# Altium schematic symbol library jlcpcb_2025_04_capacitors_extended_0603.schlib: 3668 symbols (part 11 of 20) (continued)
## CC0603KRX7R9BB393
designator C?  Capacitance: 39nF  (hidden comment: *)
Capacitor, Ceramic (MLCC), 39nF, ±10%, 50V, X7R, ±10%, SMD 0603; Manufacturer: YAGEO; Manufacturer Part Number: CC0603KRX7R9BB393; Package Size: 0603; JLCPCB Basic Part: No; JLCPCB Part Number: C107091; Supplier 1: LCSC; Category: Capacitors - MLCC; Supplier Part Number 1: C107091; Tolerance: ±10%; Voltage Rating: 50V; Temperature Coefficient: X7R; RoHS: Yes; ComponentLink1Description: Datasheet; ComponentLink1URL: https://wmsc.lcsc.com/wmsc/upload/file/pdf/v2/lcsc/2304140030_YAGEO-CC0603KRX7R9BB393_C107091.pdf; ComponentLink2Description: JLCPCB Part URL; ComponentLink2URL: https://jlcpcb.com/partdetail/C107091; ComponentLink3Description: LCSC Part URL; ComponentLink3URL: https://lcsc.com/product-detail/Multilayer-Ceramic-Capacitors-MLCC---SMD-SMT_YAGEO-YAGEO-CC0603KRX7R9BB393_C107091.html
footprint CAP-0603 (0603 (1608M) Capacitor)
pins: 1, 2

## CC0603KRX7R9BB471
designator C?  Capacitance: 470pF  (hidden comment: *)
Capacitor, Ceramic (MLCC), 470pF, ±10%, 50V, X7R, ±10%, SMD 0603; Manufacturer: YAGEO; Manufacturer Part Number: CC0603KRX7R9BB471; Package Size: 0603; JLCPCB Basic Part: No; JLCPCB Part Number: C107092; Supplier 1: LCSC; Category: Capacitors - MLCC; Supplier Part Number 1: C107092; Tolerance: ±10%; Voltage Rating: 50V; Temperature Coefficient: X7R; RoHS: Yes; ComponentLink1Description: Datasheet; ComponentLink1URL: https://wmsc.lcsc.com/wmsc/upload/file/pdf/v2/lcsc/2304140030_YAGEO-CC0603KRX7R9BB471_C107092.pdf; ComponentLink2Description: JLCPCB Part URL; ComponentLink2URL: https://jlcpcb.com/partdetail/C107092; ComponentLink3Description: LCSC Part URL; ComponentLink3URL: https://lcsc.com/product-detail/Multilayer-Ceramic-Capacitors-MLCC---SMD-SMT_YAGEO-YAGEO-CC0603KRX7R9BB471_C107092.html
footprint CAP-0603 (0603 (1608M) Capacitor)
pins: 1, 2

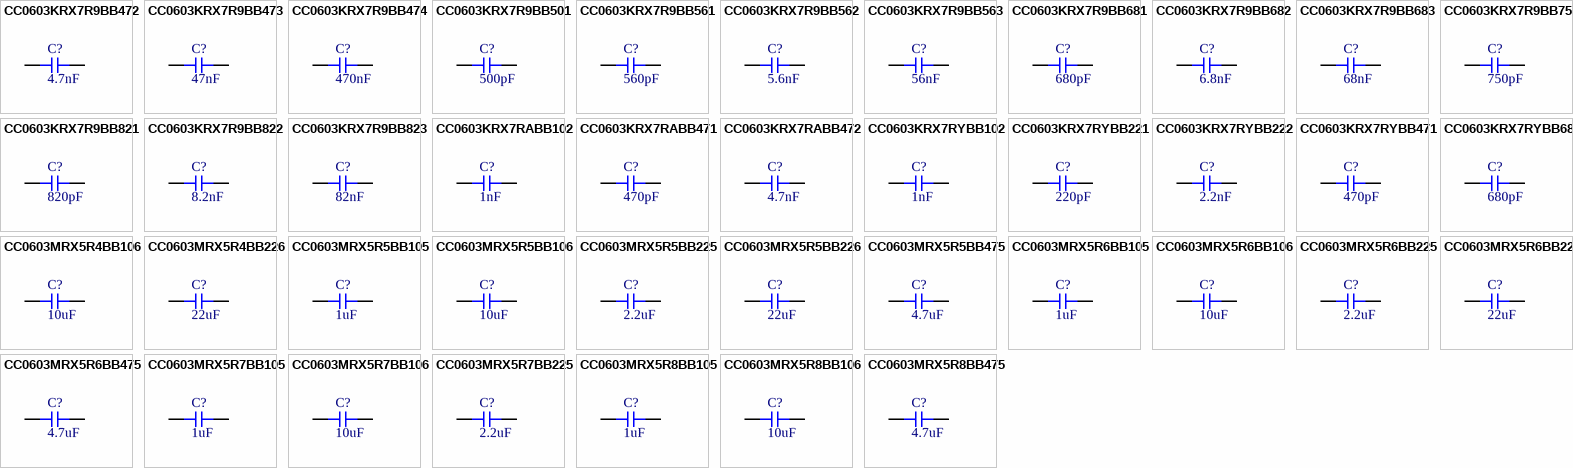
[diagram p49: symbols CC0603KRX7R9BB472 to CC0603MRX5R8BB475]

## CC0603KRX7R9BB472
designator C?  Capacitance: 4.7nF  (hidden comment: *)
Capacitor, Ceramic (MLCC), 4.7nF, ±10%, 50V, X7R, ±10%, SMD 0603; Manufacturer: YAGEO; Manufacturer Part Number: CC0603KRX7R9BB472; Package Size: 0603; JLCPCB Basic Part: No; JLCPCB Part Number: C106218; Supplier 1: LCSC; Category: Capacitors - MLCC; Supplier Part Number 1: C106218; Tolerance: ±10%; Voltage Rating: 50V; Temperature Coefficient: X7R; RoHS: Yes; ComponentLink1Description: Datasheet; ComponentLink1URL: https://wmsc.lcsc.com/wmsc/upload/file/pdf/v2/lcsc/2304140030_YAGEO-CC0603KRX7R9BB472_C106218.pdf; ComponentLink2Description: JLCPCB Part URL; ComponentLink2URL: https://jlcpcb.com/partdetail/C106218; ComponentLink3Description: LCSC Part URL; ComponentLink3URL: https://lcsc.com/product-detail/Multilayer-Ceramic-Capacitors-MLCC---SMD-SMT_YAGEO-YAGEO-CC0603KRX7R9BB472_C106218.html
footprint CAP-0603 (0603 (1608M) Capacitor)
pins: 1, 2

## CC0603KRX7R9BB473
designator C?  Capacitance: 47nF  (hidden comment: *)
Capacitor, Ceramic (MLCC), 47nF, ±10%, 50V, X7R, ±10%, SMD 0603; Manufacturer: YAGEO; Manufacturer Part Number: CC0603KRX7R9BB473; Package Size: 0603; JLCPCB Basic Part: No; JLCPCB Part Number: C107093; Supplier 1: LCSC; Category: Capacitors - MLCC; Supplier Part Number 1: C107093; Tolerance: ±10%; Voltage Rating: 50V; Temperature Coefficient: X7R; RoHS: Yes; ComponentLink1Description: Datasheet; ComponentLink1URL: https://wmsc.lcsc.com/wmsc/upload/file/pdf/v2/lcsc/2304140030_YAGEO-CC0603KRX7R9BB473_C107093.pdf; ComponentLink2Description: JLCPCB Part URL; ComponentLink2URL: https://jlcpcb.com/partdetail/C107093; ComponentLink3Description: LCSC Part URL; ComponentLink3URL: https://lcsc.com/product-detail/Multilayer-Ceramic-Capacitors-MLCC---SMD-SMT_YAGEO-YAGEO-CC0603KRX7R9BB473_C107093.html
footprint CAP-0603 (0603 (1608M) Capacitor)
pins: 1, 2

## CC0603KRX7R9BB474
designator C?  Capacitance: 470nF  (hidden comment: *)
Capacitor, Ceramic (MLCC), 470nF, ±10%, 50V, X7R, ±10%, SMD 0603; Manufacturer: YAGEO; Manufacturer Part Number: CC0603KRX7R9BB474; Package Size: 0603; JLCPCB Basic Part: No; JLCPCB Part Number: C513577; Supplier 1: LCSC; Category: Capacitors - MLCC; Supplier Part Number 1: C513577; Tolerance: ±10%; Voltage Rating: 50V; Temperature Coefficient: X7R; RoHS: Yes; ComponentLink1Description: Datasheet; ComponentLink1URL: https://wmsc.lcsc.com/wmsc/upload/file/pdf/v2/lcsc/2304140030_YAGEO-CC0603KRX7R9BB474_C513577.pdf; ComponentLink2Description: JLCPCB Part URL; ComponentLink2URL: https://jlcpcb.com/partdetail/C513577; ComponentLink3Description: LCSC Part URL; ComponentLink3URL: https://lcsc.com/product-detail/Multilayer-Ceramic-Capacitors-MLCC---SMD-SMT_YAGEO-YAGEO-CC0603KRX7R9BB474_C513577.html
footprint CAP-0603 (0603 (1608M) Capacitor)
pins: 1, 2

## CC0603KRX7R9BB501
designator C?  Capacitance: 500pF  (hidden comment: *)
Capacitor, Ceramic (MLCC), 500pF, ±10%, 50V, X7R, ±10%, SMD 0603; Manufacturer: YAGEO; Manufacturer Part Number: CC0603KRX7R9BB501; Package Size: 0603; JLCPCB Basic Part: No; JLCPCB Part Number: C519415; Supplier 1: LCSC; Category: Capacitors - MLCC; Supplier Part Number 1: C519415; Tolerance: ±10%; Voltage Rating: 50V; Temperature Coefficient: X7R; RoHS: Yes; ComponentLink1Description: Datasheet; ComponentLink1URL: https://wmsc.lcsc.com/wmsc/upload/file/pdf/v2/lcsc/2007161233_YAGEO-CC0603KRX7R9BB501_C519415.pdf; ComponentLink2Description: JLCPCB Part URL; ComponentLink2URL: https://jlcpcb.com/partdetail/C519415; ComponentLink3Description: LCSC Part URL; ComponentLink3URL: https://lcsc.com/product-detail/Multilayer-Ceramic-Capacitors-MLCC---SMD-SMT_YAGEO-YAGEO-CC0603KRX7R9BB501_C519415.html
footprint CAP-0603 (0603 (1608M) Capacitor)
pins: 1, 2

## CC0603KRX7R9BB561
designator C?  Capacitance: 560pF  (hidden comment: *)
Capacitor, Ceramic (MLCC), 560pF, ±10%, 50V, X7R, ±10%, SMD 0603; Manufacturer: YAGEO; Manufacturer Part Number: CC0603KRX7R9BB561; Package Size: 0603; JLCPCB Basic Part: No; JLCPCB Part Number: C107094; Supplier 1: LCSC; Category: Capacitors - MLCC; Supplier Part Number 1: C107094; Tolerance: ±10%; Voltage Rating: 50V; Temperature Coefficient: X7R; RoHS: Yes; ComponentLink1Description: Datasheet; ComponentLink1URL: https://wmsc.lcsc.com/wmsc/upload/file/pdf/v2/lcsc/2304140030_YAGEO-CC0603KRX7R9BB561_C107094.pdf; ComponentLink2Description: JLCPCB Part URL; ComponentLink2URL: https://jlcpcb.com/partdetail/C107094; ComponentLink3Description: LCSC Part URL; ComponentLink3URL: https://lcsc.com/product-detail/Multilayer-Ceramic-Capacitors-MLCC---SMD-SMT_YAGEO-YAGEO-CC0603KRX7R9BB561_C107094.html
footprint CAP-0603 (0603 (1608M) Capacitor)
pins: 1, 2

## CC0603KRX7R9BB562
designator C?  Capacitance: 5.6nF  (hidden comment: *)
Capacitor, Ceramic (MLCC), 5.6nF, ±10%, 50V, X7R, ±10%, SMD 0603; Manufacturer: YAGEO; Manufacturer Part Number: CC0603KRX7R9BB562; Package Size: 0603; JLCPCB Basic Part: No; JLCPCB Part Number: C107095; Supplier 1: LCSC; Category: Capacitors - MLCC; Supplier Part Number 1: C107095; Tolerance: ±10%; Voltage Rating: 50V; Temperature Coefficient: X7R; RoHS: Yes; ComponentLink1Description: Datasheet; ComponentLink1URL: https://wmsc.lcsc.com/wmsc/upload/file/pdf/v2/lcsc/2304140030_YAGEO-CC0603KRX7R9BB562_C107095.pdf; ComponentLink2Description: JLCPCB Part URL; ComponentLink2URL: https://jlcpcb.com/partdetail/C107095; ComponentLink3Description: LCSC Part URL; ComponentLink3URL: https://lcsc.com/product-detail/Multilayer-Ceramic-Capacitors-MLCC---SMD-SMT_YAGEO-YAGEO-CC0603KRX7R9BB562_C107095.html
footprint CAP-0603 (0603 (1608M) Capacitor)
pins: 1, 2

## CC0603KRX7R9BB563
designator C?  Capacitance: 56nF  (hidden comment: *)
Capacitor, Ceramic (MLCC), 56nF, ±10%, 50V, X7R, ±10%, SMD 0603; Manufacturer: YAGEO; Manufacturer Part Number: CC0603KRX7R9BB563; Package Size: 0603; JLCPCB Basic Part: No; JLCPCB Part Number: C282072; Supplier 1: LCSC; Category: Capacitors - MLCC; Supplier Part Number 1: C282072; Tolerance: ±10%; Voltage Rating: 50V; Temperature Coefficient: X7R; RoHS: Yes; ComponentLink1Description: Datasheet; ComponentLink1URL: https://wmsc.lcsc.com/wmsc/upload/file/pdf/v2/lcsc/1811082015_YAGEO-CC0603KRX7R9BB563_C282072.pdf; ComponentLink2Description: JLCPCB Part URL; ComponentLink2URL: https://jlcpcb.com/partdetail/C282072; ComponentLink3Description: LCSC Part URL; ComponentLink3URL: https://lcsc.com/product-detail/Multilayer-Ceramic-Capacitors-MLCC---SMD-SMT_YAGEO-YAGEO-CC0603KRX7R9BB563_C282072.html
footprint CAP-0603 (0603 (1608M) Capacitor)
pins: 1, 2

## CC0603KRX7R9BB681
designator C?  Capacitance: 680pF  (hidden comment: *)
Capacitor, Ceramic (MLCC), 680pF, ±10%, 50V, X7R, ±10%, SMD 0603; Manufacturer: YAGEO; Manufacturer Part Number: CC0603KRX7R9BB681; Package Size: 0603; JLCPCB Basic Part: No; JLCPCB Part Number: C107096; Supplier 1: LCSC; Category: Capacitors - MLCC; Supplier Part Number 1: C107096; Tolerance: ±10%; Voltage Rating: 50V; Temperature Coefficient: X7R; RoHS: Yes; ComponentLink1Description: Datasheet; ComponentLink1URL: https://wmsc.lcsc.com/wmsc/upload/file/pdf/v2/lcsc/2304140030_YAGEO-CC0603KRX7R9BB681_C107096.pdf; ComponentLink2Description: JLCPCB Part URL; ComponentLink2URL: https://jlcpcb.com/partdetail/C107096; ComponentLink3Description: LCSC Part URL; ComponentLink3URL: https://lcsc.com/product-detail/Multilayer-Ceramic-Capacitors-MLCC---SMD-SMT_YAGEO-YAGEO-CC0603KRX7R9BB681_C107096.html
footprint CAP-0603 (0603 (1608M) Capacitor)
pins: 1, 2

## CC0603KRX7R9BB682
designator C?  Capacitance: 6.8nF  (hidden comment: *)
Capacitor, Ceramic (MLCC), 6.8nF, ±10%, 50V, X7R, ±10%, SMD 0603; Manufacturer: YAGEO; Manufacturer Part Number: CC0603KRX7R9BB682; Package Size: 0603; JLCPCB Basic Part: No; JLCPCB Part Number: C107097; Supplier 1: LCSC; Category: Capacitors - MLCC; Supplier Part Number 1: C107097; Tolerance: ±10%; Voltage Rating: 50V; Temperature Coefficient: X7R; RoHS: Yes; ComponentLink1Description: Datasheet; ComponentLink1URL: https://wmsc.lcsc.com/wmsc/upload/file/pdf/v2/lcsc/2304140030_YAGEO-CC0603KRX7R9BB682_C107097.pdf; ComponentLink2Description: JLCPCB Part URL; ComponentLink2URL: https://jlcpcb.com/partdetail/C107097; ComponentLink3Description: LCSC Part URL; ComponentLink3URL: https://lcsc.com/product-detail/Multilayer-Ceramic-Capacitors-MLCC---SMD-SMT_YAGEO-YAGEO-CC0603KRX7R9BB682_C107097.html
footprint CAP-0603 (0603 (1608M) Capacitor)
pins: 1, 2

## CC0603KRX7R9BB683
designator C?  Capacitance: 68nF  (hidden comment: *)
Capacitor, Ceramic (MLCC), 68nF, ±10%, 50V, X7R, ±10%, SMD 0603; Manufacturer: YAGEO; Manufacturer Part Number: CC0603KRX7R9BB683; Package Size: 0603; JLCPCB Basic Part: No; JLCPCB Part Number: C107098; Supplier 1: LCSC; Category: Capacitors - MLCC; Supplier Part Number 1: C107098; Tolerance: ±10%; Voltage Rating: 50V; Temperature Coefficient: X7R; RoHS: Yes; ComponentLink1Description: Datasheet; ComponentLink1URL: https://wmsc.lcsc.com/wmsc/upload/file/pdf/v2/lcsc/2304140030_YAGEO-CC0603KRX7R9BB683_C107098.pdf; ComponentLink2Description: JLCPCB Part URL; ComponentLink2URL: https://jlcpcb.com/partdetail/C107098; ComponentLink3Description: LCSC Part URL; ComponentLink3URL: https://lcsc.com/product-detail/Multilayer-Ceramic-Capacitors-MLCC---SMD-SMT_YAGEO-YAGEO-CC0603KRX7R9BB683_C107098.html
footprint CAP-0603 (0603 (1608M) Capacitor)
pins: 1, 2

## CC0603KRX7R9BB751
designator C?  Capacitance: 750pF  (hidden comment: *)
Capacitor, Ceramic (MLCC), 750pF, ±10%, 50V, X7R, ±10%, SMD 0603; Manufacturer: YAGEO; Manufacturer Part Number: CC0603KRX7R9BB751; Package Size: 0603; JLCPCB Basic Part: No; JLCPCB Part Number: C326059; Supplier 1: LCSC; Category: Capacitors - MLCC; Supplier Part Number 1: C326059; Tolerance: ±10%; Voltage Rating: 50V; Temperature Coefficient: X7R; RoHS: Yes; ComponentLink1Description: Datasheet; ComponentLink1URL: https://wmsc.lcsc.com/wmsc/upload/file/pdf/v2/lcsc/2311211121_YAGEO-CC0603KRX7R9BB751_C326059.pdf; ComponentLink2Description: JLCPCB Part URL; ComponentLink2URL: https://jlcpcb.com/partdetail/C326059; ComponentLink3Description: LCSC Part URL; ComponentLink3URL: https://lcsc.com/product-detail/Multilayer-Ceramic-Capacitors-MLCC---SMD-SMT_YAGEO-YAGEO-CC0603KRX7R9BB751_C326059.html
footprint CAP-0603 (0603 (1608M) Capacitor)
pins: 1, 2

## CC0603KRX7R9BB821
designator C?  Capacitance: 820pF  (hidden comment: *)
Capacitor, Ceramic (MLCC), 820pF, ±10%, 50V, X7R, ±10%, SMD 0603; Manufacturer: YAGEO; Manufacturer Part Number: CC0603KRX7R9BB821; Package Size: 0603; JLCPCB Basic Part: No; JLCPCB Part Number: C107099; Supplier 1: LCSC; Category: Capacitors - MLCC; Supplier Part Number 1: C107099; Tolerance: ±10%; Voltage Rating: 50V; Temperature Coefficient: X7R; RoHS: Yes; ComponentLink1Description: Datasheet; ComponentLink1URL: https://wmsc.lcsc.com/wmsc/upload/file/pdf/v2/lcsc/2304140030_YAGEO-CC0603KRX7R9BB821_C107099.pdf; ComponentLink2Description: JLCPCB Part URL; ComponentLink2URL: https://jlcpcb.com/partdetail/C107099; ComponentLink3Description: LCSC Part URL; ComponentLink3URL: https://lcsc.com/product-detail/Multilayer-Ceramic-Capacitors-MLCC---SMD-SMT_YAGEO-YAGEO-CC0603KRX7R9BB821_C107099.html
footprint CAP-0603 (0603 (1608M) Capacitor)
pins: 1, 2

## CC0603KRX7R9BB822
designator C?  Capacitance: 8.2nF  (hidden comment: *)
Capacitor, Ceramic (MLCC), 8.2nF, ±10%, 50V, X7R, ±10%, SMD 0603; Manufacturer: YAGEO; Manufacturer Part Number: CC0603KRX7R9BB822; Package Size: 0603; JLCPCB Basic Part: No; JLCPCB Part Number: C113812; Supplier 1: LCSC; Category: Capacitors - MLCC; Supplier Part Number 1: C113812; Tolerance: ±10%; Voltage Rating: 50V; Temperature Coefficient: X7R; RoHS: Yes; ComponentLink1Description: Datasheet; ComponentLink1URL: https://wmsc.lcsc.com/wmsc/upload/file/pdf/v2/lcsc/2304140030_YAGEO-CC0603KRX7R9BB822_C113812.pdf; ComponentLink2Description: JLCPCB Part URL; ComponentLink2URL: https://jlcpcb.com/partdetail/C113812; ComponentLink3Description: LCSC Part URL; ComponentLink3URL: https://lcsc.com/product-detail/Multilayer-Ceramic-Capacitors-MLCC---SMD-SMT_YAGEO-YAGEO-CC0603KRX7R9BB822_C113812.html
footprint CAP-0603 (0603 (1608M) Capacitor)
pins: 1, 2

## CC0603KRX7R9BB823
designator C?  Capacitance: 82nF  (hidden comment: *)
Capacitor, Ceramic (MLCC), 82nF, ±10%, 50V, X7R, ±10%, SMD 0603; Manufacturer: YAGEO; Manufacturer Part Number: CC0603KRX7R9BB823; Package Size: 0603; JLCPCB Basic Part: No; JLCPCB Part Number: C107100; Supplier 1: LCSC; Category: Capacitors - MLCC; Supplier Part Number 1: C107100; Tolerance: ±10%; Voltage Rating: 50V; Temperature Coefficient: X7R; RoHS: Yes; ComponentLink1Description: Datasheet; ComponentLink1URL: https://wmsc.lcsc.com/wmsc/upload/file/pdf/v2/lcsc/2304140030_YAGEO-CC0603KRX7R9BB823_C107100.pdf; ComponentLink2Description: JLCPCB Part URL; ComponentLink2URL: https://jlcpcb.com/partdetail/C107100; ComponentLink3Description: LCSC Part URL; ComponentLink3URL: https://lcsc.com/product-detail/Multilayer-Ceramic-Capacitors-MLCC---SMD-SMT_YAGEO-YAGEO-CC0603KRX7R9BB823_C107100.html
footprint CAP-0603 (0603 (1608M) Capacitor)
pins: 1, 2

## CC0603KRX7RABB102
designator C?  Capacitance: 1nF  (hidden comment: *)
Capacitor, Ceramic (MLCC), 1nF, ±10%, 200V, X7R, ±10%, SMD 0603; Manufacturer: YAGEO; Manufacturer Part Number: CC0603KRX7RABB102; Package Size: 0603; JLCPCB Basic Part: No; JLCPCB Part Number: C282243; Supplier 1: LCSC; Category: Capacitors - MLCC; Supplier Part Number 1: C282243; Tolerance: ±10%; Voltage Rating: 200V; Temperature Coefficient: X7R; RoHS: Yes; ComponentLink1Description: Datasheet; ComponentLink1URL: https://wmsc.lcsc.com/wmsc/upload/file/pdf/v2/lcsc/1811082032_YAGEO-CC0603KRX7RABB102_C282243.pdf; ComponentLink2Description: JLCPCB Part URL; ComponentLink2URL: https://jlcpcb.com/partdetail/C282243; ComponentLink3Description: LCSC Part URL; ComponentLink3URL: https://lcsc.com/product-detail/Multilayer-Ceramic-Capacitors-MLCC---SMD-SMT_YAGEO-YAGEO-CC0603KRX7RABB102_C282243.html
footprint CAP-0603 (0603 (1608M) Capacitor)
pins: 1, 2

## CC0603KRX7RABB471
designator C?  Capacitance: 470pF  (hidden comment: *)
Capacitor, Ceramic (MLCC), 470pF, ±10%, 200V, X7R, ±10%, SMD 0603; Manufacturer: YAGEO; Manufacturer Part Number: CC0603KRX7RABB471; Package Size: 0603; JLCPCB Basic Part: No; JLCPCB Part Number: C2936583; Supplier 1: LCSC; Category: Capacitors - MLCC; Supplier Part Number 1: C2936583; Tolerance: ±10%; Voltage Rating: 200V; Temperature Coefficient: X7R; RoHS: Yes; ComponentLink1Description: Datasheet; ComponentLink1URL: https://wmsc.lcsc.com/wmsc/upload/file/pdf/v2/lcsc/2201121730_YAGEO-CC0603KRX7RABB471_C2936583.pdf; ComponentLink2Description: JLCPCB Part URL; ComponentLink2URL: https://jlcpcb.com/partdetail/C2936583; ComponentLink3Description: LCSC Part URL; ComponentLink3URL: https://lcsc.com/product-detail/Multilayer-Ceramic-Capacitors-MLCC---SMD-SMT_YAGEO-YAGEO-CC0603KRX7RABB471_C2936583.html
footprint CAP-0603 (0603 (1608M) Capacitor)
pins: 1, 2

## CC0603KRX7RABB472
designator C?  Capacitance: 4.7nF  (hidden comment: *)
Capacitor, Ceramic (MLCC), 4.7nF, ±10%, 200V, X7R, ±10%, SMD 0603; Manufacturer: YAGEO; Manufacturer Part Number: CC0603KRX7RABB472; Package Size: 0603; JLCPCB Basic Part: No; JLCPCB Part Number: C596328; Supplier 1: LCSC; Category: Capacitors - MLCC; Supplier Part Number 1: C596328; Tolerance: ±10%; Voltage Rating: 200V; Temperature Coefficient: X7R; RoHS: Yes; ComponentLink1Description: Datasheet; ComponentLink1URL: https://wmsc.lcsc.com/wmsc/upload/file/pdf/v2/lcsc/2006091816_YAGEO-CC0603KRX7RABB472_C596328.pdf; ComponentLink2Description: JLCPCB Part URL; ComponentLink2URL: https://jlcpcb.com/partdetail/C596328; ComponentLink3Description: LCSC Part URL; ComponentLink3URL: https://lcsc.com/product-detail/Multilayer-Ceramic-Capacitors-MLCC---SMD-SMT_YAGEO-YAGEO-CC0603KRX7RABB472_C596328.html
footprint CAP-0603 (0603 (1608M) Capacitor)
pins: 1, 2

## CC0603KRX7RYBB102
designator C?  Capacitance: 1nF  (hidden comment: *)
Capacitor, Ceramic (MLCC), 1nF, ±10%, 250V, X7R, ±10%, SMD 0603; Manufacturer: YAGEO; Manufacturer Part Number: CC0603KRX7RYBB102; Package Size: 0603; JLCPCB Basic Part: No; JLCPCB Part Number: C277510; Supplier 1: LCSC; Category: Capacitors - MLCC; Supplier Part Number 1: C277510; Tolerance: ±10%; Voltage Rating: 250V; Temperature Coefficient: X7R; RoHS: Yes; ComponentLink1Description: Datasheet; ComponentLink1URL: https://wmsc.lcsc.com/wmsc/upload/file/pdf/v2/lcsc/2304140030_YAGEO-CC0603KRX7RYBB102_C277510.pdf; ComponentLink2Description: JLCPCB Part URL; ComponentLink2URL: https://jlcpcb.com/partdetail/C277510; ComponentLink3Description: LCSC Part URL; ComponentLink3URL: https://lcsc.com/product-detail/Multilayer-Ceramic-Capacitors-MLCC---SMD-SMT_YAGEO-YAGEO-CC0603KRX7RYBB102_C277510.html
footprint CAP-0603 (0603 (1608M) Capacitor)
pins: 1, 2

## CC0603KRX7RYBB221
designator C?  Capacitance: 220pF  (hidden comment: *)
Capacitor, Ceramic (MLCC), 220pF, ±10%, 250V, X7R, ±10%, SMD 0603; Manufacturer: YAGEO; Manufacturer Part Number: CC0603KRX7RYBB221; Package Size: 0603; JLCPCB Basic Part: No; JLCPCB Part Number: C107101; Supplier 1: LCSC; Category: Capacitors - MLCC; Supplier Part Number 1: C107101; Tolerance: ±10%; Voltage Rating: 250V; Temperature Coefficient: X7R; RoHS: Yes; ComponentLink1Description: Datasheet; ComponentLink1URL: https://wmsc.lcsc.com/wmsc/upload/file/pdf/v2/lcsc/2304140030_YAGEO-CC0603KRX7RYBB221_C107101.pdf; ComponentLink2Description: JLCPCB Part URL; ComponentLink2URL: https://jlcpcb.com/partdetail/C107101; ComponentLink3Description: LCSC Part URL; ComponentLink3URL: https://lcsc.com/product-detail/Multilayer-Ceramic-Capacitors-MLCC---SMD-SMT_YAGEO-YAGEO-CC0603KRX7RYBB221_C107101.html
footprint CAP-0603 (0603 (1608M) Capacitor)
pins: 1, 2

## CC0603KRX7RYBB222
designator C?  Capacitance: 2.2nF  (hidden comment: *)
Capacitor, Ceramic (MLCC), 2.2nF, ±10%, 250V, X7R, ±10%, SMD 0603; Manufacturer: YAGEO; Manufacturer Part Number: CC0603KRX7RYBB222; Package Size: 0603; JLCPCB Basic Part: No; JLCPCB Part Number: C576857; Supplier 1: LCSC; Category: Capacitors - MLCC; Supplier Part Number 1: C576857; Tolerance: ±10%; Voltage Rating: 250V; Temperature Coefficient: X7R; RoHS: Yes; ComponentLink1Description: Datasheet; ComponentLink1URL: https://wmsc.lcsc.com/wmsc/upload/file/pdf/v2/lcsc/2008171233_YAGEO-CC0603KRX7RYBB222_C576857.pdf; ComponentLink2Description: JLCPCB Part URL; ComponentLink2URL: https://jlcpcb.com/partdetail/C576857; ComponentLink3Description: LCSC Part URL; ComponentLink3URL: https://lcsc.com/product-detail/Multilayer-Ceramic-Capacitors-MLCC---SMD-SMT_YAGEO-YAGEO-CC0603KRX7RYBB222_C576857.html
footprint CAP-0603 (0603 (1608M) Capacitor)
pins: 1, 2

## CC0603KRX7RYBB471
designator C?  Capacitance: 470pF  (hidden comment: *)
Capacitor, Ceramic (MLCC), 470pF, ±10%, 250V, X7R, ±10%, SMD 0603; Manufacturer: YAGEO; Manufacturer Part Number: CC0603KRX7RYBB471; Package Size: 0603; JLCPCB Basic Part: No; JLCPCB Part Number: C576858; Supplier 1: LCSC; Category: Capacitors - MLCC; Supplier Part Number 1: C576858; Tolerance: ±10%; Voltage Rating: 250V; Temperature Coefficient: X7R; RoHS: Yes; ComponentLink1Description: Datasheet; ComponentLink1URL: https://wmsc.lcsc.com/wmsc/upload/file/pdf/v2/lcsc/2201242200_YAGEO-CC0603KRX7RYBB471_C576858.pdf; ComponentLink2Description: JLCPCB Part URL; ComponentLink2URL: https://jlcpcb.com/partdetail/C576858; ComponentLink3Description: LCSC Part URL; ComponentLink3URL: https://lcsc.com/product-detail/Multilayer-Ceramic-Capacitors-MLCC---SMD-SMT_YAGEO-YAGEO-CC0603KRX7RYBB471_C576858.html
footprint CAP-0603 (0603 (1608M) Capacitor)
pins: 1, 2

## CC0603KRX7RYBB681
designator C?  Capacitance: 680pF  (hidden comment: *)
Capacitor, Ceramic (MLCC), 680pF, ±10%, 250V, X7R, ±10%, SMD 0603; Manufacturer: YAGEO; Manufacturer Part Number: CC0603KRX7RYBB681; Package Size: 0603; JLCPCB Basic Part: No; JLCPCB Part Number: C327226; Supplier 1: LCSC; Category: Capacitors - MLCC; Supplier Part Number 1: C327226; Tolerance: ±10%; Voltage Rating: 250V; Temperature Coefficient: X7R; RoHS: Yes; ComponentLink1Description: Datasheet; ComponentLink1URL: https://wmsc.lcsc.com/wmsc/upload/file/pdf/v2/lcsc/1811141225_YAGEO-CC0603KRX7RYBB681_C327226.pdf; ComponentLink2Description: JLCPCB Part URL; ComponentLink2URL: https://jlcpcb.com/partdetail/C327226; ComponentLink3Description: LCSC Part URL; ComponentLink3URL: https://lcsc.com/product-detail/Multilayer-Ceramic-Capacitors-MLCC---SMD-SMT_YAGEO-YAGEO-CC0603KRX7RYBB681_C327226.html
footprint CAP-0603 (0603 (1608M) Capacitor)
pins: 1, 2

## CC0603MRX5R4BB106
designator C?  Capacitance: 10uF  (hidden comment: *)
Capacitor, Ceramic (MLCC), 10uF, ±20%, 4V, X5R, ±20%, SMD 0603; Manufacturer: YAGEO; Manufacturer Part Number: CC0603MRX5R4BB106; Package Size: 0603; JLCPCB Basic Part: No; JLCPCB Part Number: C527072; Supplier 1: LCSC; Category: Capacitors - MLCC; Supplier Part Number 1: C527072; Tolerance: ±20%; Voltage Rating: 4V; Temperature Coefficient: X5R; RoHS: Yes; ComponentLink1Description: Datasheet; ComponentLink1URL: https://wmsc.lcsc.com/wmsc/upload/file/pdf/v2/lcsc/2407081117_YAGEO-CC0603MRX5R4BB106_C527072.pdf; ComponentLink2Description: JLCPCB Part URL; ComponentLink2URL: https://jlcpcb.com/partdetail/C527072; ComponentLink3Description: LCSC Part URL; ComponentLink3URL: https://lcsc.com/product-detail/Multilayer-Ceramic-Capacitors-MLCC---SMD-SMT_YAGEO-YAGEO-CC0603MRX5R4BB106_C527072.html
footprint CAP-0603 (0603 (1608M) Capacitor)
pins: 1, 2

## CC0603MRX5R4BB226
designator C?  Capacitance: 22uF  (hidden comment: *)
Capacitor, Ceramic (MLCC), 22uF, ±20%, 4V, X5R, ±20%, SMD 0603; Manufacturer: YAGEO; Manufacturer Part Number: CC0603MRX5R4BB226; Package Size: 0603; JLCPCB Basic Part: No; JLCPCB Part Number: C2178532; Supplier 1: LCSC; Category: Capacitors - MLCC; Supplier Part Number 1: C2178532; Tolerance: ±20%; Voltage Rating: 4V; Temperature Coefficient: X5R; RoHS: Yes; ComponentLink1Description: Datasheet; ComponentLink1URL: https://wmsc.lcsc.com/wmsc/upload/file/pdf/v2/lcsc/2407081117_YAGEO-CC0603MRX5R4BB226_C2178532.pdf; ComponentLink2Description: JLCPCB Part URL; ComponentLink2URL: https://jlcpcb.com/partdetail/C2178532; ComponentLink3Description: LCSC Part URL; ComponentLink3URL: https://lcsc.com/product-detail/Multilayer-Ceramic-Capacitors-MLCC---SMD-SMT_YAGEO-YAGEO-CC0603MRX5R4BB226_C2178532.html
footprint CAP-0603 (0603 (1608M) Capacitor)
pins: 1, 2

## CC0603MRX5R5BB105
designator C?  Capacitance: 1uF  (hidden comment: *)
Capacitor, Ceramic (MLCC), 1uF, ±20%, 6.3V, X5R, ±20%, SMD 0603; Manufacturer: YAGEO; Manufacturer Part Number: CC0603MRX5R5BB105; Package Size: 0603; JLCPCB Basic Part: No; JLCPCB Part Number: C576859; Supplier 1: LCSC; Category: Capacitors - MLCC; Supplier Part Number 1: C576859; Tolerance: ±20%; Voltage Rating: 6.3V; Temperature Coefficient: X5R; RoHS: Yes; ComponentLink1Description: Datasheet; ComponentLink1URL: https://wmsc.lcsc.com/wmsc/upload/file/pdf/v2/lcsc/2407081117_YAGEO-CC0603MRX5R5BB105_C576859.pdf; ComponentLink2Description: JLCPCB Part URL; ComponentLink2URL: https://jlcpcb.com/partdetail/C576859; ComponentLink3Description: LCSC Part URL; ComponentLink3URL: https://lcsc.com/product-detail/Multilayer-Ceramic-Capacitors-MLCC---SMD-SMT_YAGEO-YAGEO-CC0603MRX5R5BB105_C576859.html
footprint CAP-0603 (0603 (1608M) Capacitor)
pins: 1, 2

## CC0603MRX5R5BB106
designator C?  Capacitance: 10uF  (hidden comment: *)
Capacitor, Ceramic (MLCC), 10uF, ±20%, 6.3V, X5R, ±20%, SMD 0603; Manufacturer: YAGEO; Manufacturer Part Number: CC0603MRX5R5BB106; Package Size: 0603; JLCPCB Basic Part: No; JLCPCB Part Number: C109454; Supplier 1: LCSC; Category: Capacitors - MLCC; Supplier Part Number 1: C109454; Tolerance: ±20%; Voltage Rating: 6.3V; Temperature Coefficient: X5R; RoHS: Yes; ComponentLink1Description: Datasheet; ComponentLink1URL: https://wmsc.lcsc.com/wmsc/upload/file/pdf/v2/lcsc/2407081117_YAGEO-CC0603MRX5R5BB106_C109454.pdf; ComponentLink2Description: JLCPCB Part URL; ComponentLink2URL: https://jlcpcb.com/partdetail/C109454; ComponentLink3Description: LCSC Part URL; ComponentLink3URL: https://lcsc.com/product-detail/Multilayer-Ceramic-Capacitors-MLCC---SMD-SMT_YAGEO-YAGEO-CC0603MRX5R5BB106_C109454.html
footprint CAP-0603 (0603 (1608M) Capacitor)
pins: 1, 2

## CC0603MRX5R5BB225
designator C?  Capacitance: 2.2uF  (hidden comment: *)
Capacitor, Ceramic (MLCC), 2.2uF, ±20%, 6.3V, X5R, ±20%, SMD 0603; Manufacturer: YAGEO; Manufacturer Part Number: CC0603MRX5R5BB225; Package Size: 0603; JLCPCB Basic Part: No; JLCPCB Part Number: C576860; Supplier 1: LCSC; Category: Capacitors - MLCC; Supplier Part Number 1: C576860; Tolerance: ±20%; Voltage Rating: 6.3V; Temperature Coefficient: X5R; RoHS: Yes; ComponentLink1Description: Datasheet; ComponentLink1URL: https://wmsc.lcsc.com/wmsc/upload/file/pdf/v2/lcsc/2407081117_YAGEO-CC0603MRX5R5BB225_C576860.pdf; ComponentLink2Description: JLCPCB Part URL; ComponentLink2URL: https://jlcpcb.com/partdetail/C576860; ComponentLink3Description: LCSC Part URL; ComponentLink3URL: https://lcsc.com/product-detail/Multilayer-Ceramic-Capacitors-MLCC---SMD-SMT_YAGEO-YAGEO-CC0603MRX5R5BB225_C576860.html
footprint CAP-0603 (0603 (1608M) Capacitor)
pins: 1, 2

## CC0603MRX5R5BB226
designator C?  Capacitance: 22uF  (hidden comment: *)
Capacitor, Ceramic (MLCC), 22uF, ±20%, 6.3V, X5R, ±20%, SMD 0603; Manufacturer: YAGEO; Manufacturer Part Number: CC0603MRX5R5BB226; Package Size: 0603; JLCPCB Basic Part: No; JLCPCB Part Number: C109448; Supplier 1: LCSC; Category: Capacitors - MLCC; Supplier Part Number 1: C109448; Tolerance: ±20%; Voltage Rating: 6.3V; Temperature Coefficient: X5R; RoHS: Yes; ComponentLink1Description: Datasheet; ComponentLink1URL: https://wmsc.lcsc.com/wmsc/upload/file/pdf/v2/lcsc/2407081117_YAGEO-CC0603MRX5R5BB226_C109448.pdf; ComponentLink2Description: JLCPCB Part URL; ComponentLink2URL: https://jlcpcb.com/partdetail/C109448; ComponentLink3Description: LCSC Part URL; ComponentLink3URL: https://lcsc.com/product-detail/Multilayer-Ceramic-Capacitors-MLCC---SMD-SMT_YAGEO-YAGEO-CC0603MRX5R5BB226_C109448.html
footprint CAP-0603 (0603 (1608M) Capacitor)
pins: 1, 2

## CC0603MRX5R5BB475
designator C?  Capacitance: 4.7uF  (hidden comment: *)
Capacitor, Ceramic (MLCC), 4.7uF, ±20%, 6.3V, X5R, ±20%, SMD 0603; Manufacturer: YAGEO; Manufacturer Part Number: CC0603MRX5R5BB475; Package Size: 0603; JLCPCB Basic Part: No; JLCPCB Part Number: C527073; Supplier 1: LCSC; Category: Capacitors - MLCC; Supplier Part Number 1: C527073; Tolerance: ±20%; Voltage Rating: 6.3V; Temperature Coefficient: X5R; RoHS: Yes; ComponentLink1Description: Datasheet; ComponentLink1URL: https://wmsc.lcsc.com/wmsc/upload/file/pdf/v2/lcsc/2407081117_YAGEO-CC0603MRX5R5BB475_C527073.pdf; ComponentLink2Description: JLCPCB Part URL; ComponentLink2URL: https://jlcpcb.com/partdetail/C527073; ComponentLink3Description: LCSC Part URL; ComponentLink3URL: https://lcsc.com/product-detail/Multilayer-Ceramic-Capacitors-MLCC---SMD-SMT_YAGEO-YAGEO-CC0603MRX5R5BB475_C527073.html
footprint CAP-0603 (0603 (1608M) Capacitor)
pins: 1, 2

## CC0603MRX5R6BB105
designator C?  Capacitance: 1uF  (hidden comment: *)
Capacitor, Ceramic (MLCC), 1uF, ±20%, 10V, X5R, ±20%, SMD 0603; Manufacturer: YAGEO; Manufacturer Part Number: CC0603MRX5R6BB105; Package Size: 0603; JLCPCB Basic Part: No; JLCPCB Part Number: C576861; Supplier 1: LCSC; Category: Capacitors - MLCC; Supplier Part Number 1: C576861; Tolerance: ±20%; Voltage Rating: 10V; Temperature Coefficient: X5R; RoHS: Yes; ComponentLink1Description: Datasheet; ComponentLink1URL: https://wmsc.lcsc.com/wmsc/upload/file/pdf/v2/lcsc/2407081117_YAGEO-CC0603MRX5R6BB105_C576861.pdf; ComponentLink2Description: JLCPCB Part URL; ComponentLink2URL: https://jlcpcb.com/partdetail/C576861; ComponentLink3Description: LCSC Part URL; ComponentLink3URL: https://lcsc.com/product-detail/Multilayer-Ceramic-Capacitors-MLCC---SMD-SMT_YAGEO-YAGEO-CC0603MRX5R6BB105_C576861.html
footprint CAP-0603 (0603 (1608M) Capacitor)
pins: 1, 2

## CC0603MRX5R6BB106
designator C?  Capacitance: 10uF  (hidden comment: *)
Capacitor, Ceramic (MLCC), 10uF, ±20%, 10V, X5R, ±20%, SMD 0603; Manufacturer: YAGEO; Manufacturer Part Number: CC0603MRX5R6BB106; Package Size: 0603; JLCPCB Basic Part: No; JLCPCB Part Number: C109453; Supplier 1: LCSC; Category: Capacitors - MLCC; Supplier Part Number 1: C109453; Tolerance: ±20%; Voltage Rating: 10V; Temperature Coefficient: X5R; RoHS: Yes; ComponentLink1Description: Datasheet; ComponentLink1URL: https://wmsc.lcsc.com/wmsc/upload/file/pdf/v2/lcsc/2407081117_YAGEO-CC0603MRX5R6BB106_C109453.pdf; ComponentLink2Description: JLCPCB Part URL; ComponentLink2URL: https://jlcpcb.com/partdetail/C109453; ComponentLink3Description: LCSC Part URL; ComponentLink3URL: https://lcsc.com/product-detail/Multilayer-Ceramic-Capacitors-MLCC---SMD-SMT_YAGEO-YAGEO-CC0603MRX5R6BB106_C109453.html
footprint CAP-0603 (0603 (1608M) Capacitor)
pins: 1, 2

## CC0603MRX5R6BB225
designator C?  Capacitance: 2.2uF  (hidden comment: *)
Capacitor, Ceramic (MLCC), 2.2uF, ±20%, 10V, X5R, ±20%, SMD 0603; Manufacturer: YAGEO; Manufacturer Part Number: CC0603MRX5R6BB225; Package Size: 0603; JLCPCB Basic Part: No; JLCPCB Part Number: C519447; Supplier 1: LCSC; Category: Capacitors - MLCC; Supplier Part Number 1: C519447; Tolerance: ±20%; Voltage Rating: 10V; Temperature Coefficient: X5R; RoHS: Yes; ComponentLink1Description: Datasheet; ComponentLink1URL: https://wmsc.lcsc.com/wmsc/upload/file/pdf/v2/lcsc/2407081117_YAGEO-CC0603MRX5R6BB225_C519447.pdf; ComponentLink2Description: JLCPCB Part URL; ComponentLink2URL: https://jlcpcb.com/partdetail/C519447; ComponentLink3Description: LCSC Part URL; ComponentLink3URL: https://lcsc.com/product-detail/Multilayer-Ceramic-Capacitors-MLCC---SMD-SMT_YAGEO-YAGEO-CC0603MRX5R6BB225_C519447.html
footprint CAP-0603 (0603 (1608M) Capacitor)
pins: 1, 2

## CC0603MRX5R6BB226
designator C?  Capacitance: 22uF  (hidden comment: *)
Capacitor, Ceramic (MLCC), 22uF, ±20%, 10V, X5R, ±20%, SMD 0603; Manufacturer: YAGEO; Manufacturer Part Number: CC0603MRX5R6BB226; Package Size: 0603; JLCPCB Basic Part: No; JLCPCB Part Number: C109447; Supplier 1: LCSC; Category: Capacitors - MLCC; Supplier Part Number 1: C109447; Tolerance: ±20%; Voltage Rating: 10V; Temperature Coefficient: X5R; RoHS: Yes; ComponentLink1Description: Datasheet; ComponentLink1URL: https://wmsc.lcsc.com/wmsc/upload/file/pdf/v2/lcsc/2407081117_YAGEO-CC0603MRX5R6BB226_C109447.pdf; ComponentLink2Description: JLCPCB Part URL; ComponentLink2URL: https://jlcpcb.com/partdetail/C109447; ComponentLink3Description: LCSC Part URL; ComponentLink3URL: https://lcsc.com/product-detail/Multilayer-Ceramic-Capacitors-MLCC---SMD-SMT_YAGEO-YAGEO-CC0603MRX5R6BB226_C109447.html
footprint CAP-0603 (0603 (1608M) Capacitor)
pins: 1, 2

## CC0603MRX5R6BB475
designator C?  Capacitance: 4.7uF  (hidden comment: *)
Capacitor, Ceramic (MLCC), 4.7uF, ±20%, 10V, X5R, ±20%, SMD 0603; Manufacturer: YAGEO; Manufacturer Part Number: CC0603MRX5R6BB475; Package Size: 0603; JLCPCB Basic Part: No; JLCPCB Part Number: C695178; Supplier 1: LCSC; Category: Capacitors - MLCC; Supplier Part Number 1: C695178; Tolerance: ±20%; Voltage Rating: 10V; Temperature Coefficient: X5R; RoHS: Yes; ComponentLink1Description: Datasheet; ComponentLink1URL: https://wmsc.lcsc.com/wmsc/upload/file/pdf/v2/lcsc/2407081117_YAGEO-CC0603MRX5R6BB475_C695178.pdf; ComponentLink2Description: JLCPCB Part URL; ComponentLink2URL: https://jlcpcb.com/partdetail/C695178; ComponentLink3Description: LCSC Part URL; ComponentLink3URL: https://lcsc.com/product-detail/Multilayer-Ceramic-Capacitors-MLCC---SMD-SMT_YAGEO-YAGEO-CC0603MRX5R6BB475_C695178.html
footprint CAP-0603 (0603 (1608M) Capacitor)
pins: 1, 2

## CC0603MRX5R7BB105
designator C?  Capacitance: 1uF  (hidden comment: *)
Capacitor, Ceramic (MLCC), 1uF, ±20%, 16V, X5R, ±20%, SMD 0603; Manufacturer: YAGEO; Manufacturer Part Number: CC0603MRX5R7BB105; Package Size: 0603; JLCPCB Basic Part: No; JLCPCB Part Number: C576862; Supplier 1: LCSC; Category: Capacitors - MLCC; Supplier Part Number 1: C576862; Tolerance: ±20%; Voltage Rating: 16V; Temperature Coefficient: X5R; RoHS: Yes; ComponentLink1Description: Datasheet; ComponentLink1URL: https://wmsc.lcsc.com/wmsc/upload/file/pdf/v2/lcsc/2407081117_YAGEO-CC0603MRX5R7BB105_C576862.pdf; ComponentLink2Description: JLCPCB Part URL; ComponentLink2URL: https://jlcpcb.com/partdetail/C576862; ComponentLink3Description: LCSC Part URL; ComponentLink3URL: https://lcsc.com/product-detail/Multilayer-Ceramic-Capacitors-MLCC---SMD-SMT_YAGEO-YAGEO-CC0603MRX5R7BB105_C576862.html
footprint CAP-0603 (0603 (1608M) Capacitor)
pins: 1, 2

## CC0603MRX5R7BB106
designator C?  Capacitance: 10uF  (hidden comment: *)
Capacitor, Ceramic (MLCC), 10uF, ±20%, 16V, X5R, ±20%, SMD 0603; Manufacturer: YAGEO; Manufacturer Part Number: CC0603MRX5R7BB106; Package Size: 0603; JLCPCB Basic Part: No; JLCPCB Part Number: C109457; Supplier 1: LCSC; Category: Capacitors - MLCC; Supplier Part Number 1: C109457; Tolerance: ±20%; Voltage Rating: 16V; Temperature Coefficient: X5R; RoHS: Yes; ComponentLink1Description: Datasheet; ComponentLink1URL: https://wmsc.lcsc.com/wmsc/upload/file/pdf/v2/lcsc/2407081117_YAGEO-CC0603MRX5R7BB106_C109457.pdf; ComponentLink2Description: JLCPCB Part URL; ComponentLink2URL: https://jlcpcb.com/partdetail/C109457; ComponentLink3Description: LCSC Part URL; ComponentLink3URL: https://lcsc.com/product-detail/Multilayer-Ceramic-Capacitors-MLCC---SMD-SMT_YAGEO-YAGEO-CC0603MRX5R7BB106_C109457.html
footprint CAP-0603 (0603 (1608M) Capacitor)
pins: 1, 2

## CC0603MRX5R7BB225
designator C?  Capacitance: 2.2uF  (hidden comment: *)
Capacitor, Ceramic (MLCC), 2.2uF, ±20%, 16V, X5R, ±20%, SMD 0603; Manufacturer: YAGEO; Manufacturer Part Number: CC0603MRX5R7BB225; Package Size: 0603; JLCPCB Basic Part: No; JLCPCB Part Number: C2169170; Supplier 1: LCSC; Category: Capacitors - MLCC; Supplier Part Number 1: C2169170; Tolerance: ±20%; Voltage Rating: 16V; Temperature Coefficient: X5R; RoHS: Yes; ComponentLink1Description: Datasheet; ComponentLink1URL: https://wmsc.lcsc.com/wmsc/upload/file/pdf/v2/lcsc/2407081117_YAGEO-CC0603MRX5R7BB225_C2169170.pdf; ComponentLink2Description: JLCPCB Part URL; ComponentLink2URL: https://jlcpcb.com/partdetail/C2169170; ComponentLink3Description: LCSC Part URL; ComponentLink3URL: https://lcsc.com/product-detail/Multilayer-Ceramic-Capacitors-MLCC---SMD-SMT_YAGEO-YAGEO-CC0603MRX5R7BB225_C2169170.html
footprint CAP-0603 (0603 (1608M) Capacitor)
pins: 1, 2

## CC0603MRX5R8BB105
designator C?  Capacitance: 1uF  (hidden comment: *)
Capacitor, Ceramic (MLCC), 1uF, ±20%, 25V, X5R, ±20%, SMD 0603; Manufacturer: YAGEO; Manufacturer Part Number: CC0603MRX5R8BB105; Package Size: 0603; JLCPCB Basic Part: No; JLCPCB Part Number: C576863; Supplier 1: LCSC; Category: Capacitors - MLCC; Supplier Part Number 1: C576863; Tolerance: ±20%; Voltage Rating: 25V; Temperature Coefficient: X5R; RoHS: Yes; ComponentLink1Description: Datasheet; ComponentLink1URL: https://wmsc.lcsc.com/wmsc/upload/file/pdf/v2/lcsc/2407081117_YAGEO-CC0603MRX5R8BB105_C576863.pdf; ComponentLink2Description: JLCPCB Part URL; ComponentLink2URL: https://jlcpcb.com/partdetail/C576863; ComponentLink3Description: LCSC Part URL; ComponentLink3URL: https://lcsc.com/product-detail/Multilayer-Ceramic-Capacitors-MLCC---SMD-SMT_YAGEO-YAGEO-CC0603MRX5R8BB105_C576863.html
footprint CAP-0603 (0603 (1608M) Capacitor)
pins: 1, 2

## CC0603MRX5R8BB106
designator C?  Capacitance: 10uF  (hidden comment: *)
Capacitor, Ceramic (MLCC), 10uF, ±20%, 25V, X5R, ±20%, SMD 0603; Manufacturer: YAGEO; Manufacturer Part Number: CC0603MRX5R8BB106; Package Size: 0603; JLCPCB Basic Part: No; JLCPCB Part Number: C596327; Supplier 1: LCSC; Category: Capacitors - MLCC; Supplier Part Number 1: C596327; Tolerance: ±20%; Voltage Rating: 25V; Temperature Coefficient: X5R; RoHS: Yes; ComponentLink1Description: Datasheet; ComponentLink1URL: https://wmsc.lcsc.com/wmsc/upload/file/pdf/v2/lcsc/2407081117_YAGEO-CC0603MRX5R8BB106_C596327.pdf; ComponentLink2Description: JLCPCB Part URL; ComponentLink2URL: https://jlcpcb.com/partdetail/C596327; ComponentLink3Description: LCSC Part URL; ComponentLink3URL: https://lcsc.com/product-detail/Multilayer-Ceramic-Capacitors-MLCC---SMD-SMT_YAGEO-YAGEO-CC0603MRX5R8BB106_C596327.html
footprint CAP-0603 (0603 (1608M) Capacitor)
pins: 1, 2

## CC0603MRX5R8BB475
designator C?  Capacitance: 4.7uF  (hidden comment: *)
Capacitor, Ceramic (MLCC), 4.7uF, ±20%, 25V, X5R, ±20%, SMD 0603; Manufacturer: YAGEO; Manufacturer Part Number: CC0603MRX5R8BB475; Package Size: 0603; JLCPCB Basic Part: No; JLCPCB Part Number: C723706; Supplier 1: LCSC; Category: Capacitors - MLCC; Supplier Part Number 1: C723706; Tolerance: ±20%; Voltage Rating: 25V; Temperature Coefficient: X5R; RoHS: Yes; ComponentLink1Description: Datasheet; ComponentLink1URL: https://wmsc.lcsc.com/wmsc/upload/file/pdf/v2/lcsc/2407081117_YAGEO-CC0603MRX5R8BB475_C723706.pdf; ComponentLink2Description: JLCPCB Part URL; ComponentLink2URL: https://jlcpcb.com/partdetail/C723706; ComponentLink3Description: LCSC Part URL; ComponentLink3URL: https://lcsc.com/product-detail/Multilayer-Ceramic-Capacitors-MLCC---SMD-SMT_YAGEO-YAGEO-CC0603MRX5R8BB475_C723706.html
footprint CAP-0603 (0603 (1608M) Capacitor)
pins: 1, 2

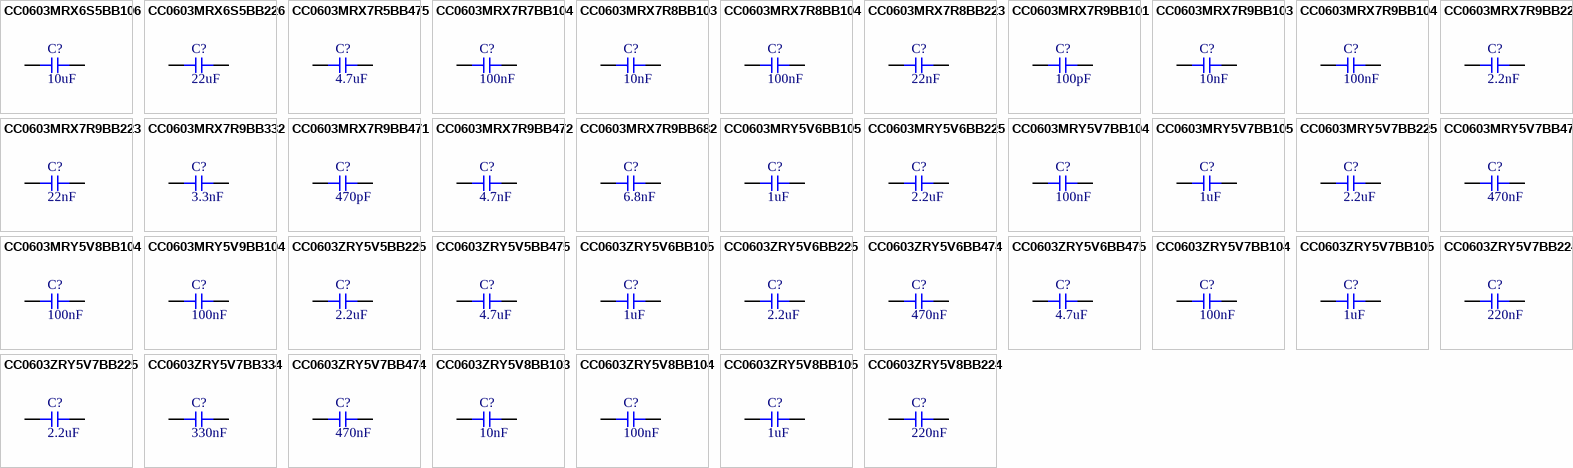
[diagram p50: symbols CC0603MRX6S5BB106 to CC0603ZRY5V8BB224]

## CC0603MRX6S5BB106
designator C?  Capacitance: 10uF  (hidden comment: *)
Capacitor, Ceramic (MLCC), 10uF, ±20%, 6.3V, X6S, ±20%, SMD 0603; Manufacturer: YAGEO; Manufacturer Part Number: CC0603MRX6S5BB106; Package Size: 0603; JLCPCB Basic Part: No; JLCPCB Part Number: C3879288; Supplier 1: LCSC; Category: Capacitors - MLCC; Supplier Part Number 1: C3879288; Tolerance: ±20%; Voltage Rating: 6.3V; Temperature Coefficient: X6S; RoHS: Yes; ComponentLink1Description: Datasheet; ComponentLink1URL: https://wmsc.lcsc.com/wmsc/upload/file/pdf/v2/lcsc/2311211121_YAGEO-CC0603MRX6S5BB106_C3879288.pdf; ComponentLink2Description: JLCPCB Part URL; ComponentLink2URL: https://jlcpcb.com/partdetail/C3879288; ComponentLink3Description: LCSC Part URL; ComponentLink3URL: https://lcsc.com/product-detail/Multilayer-Ceramic-Capacitors-MLCC---SMD-SMT_YAGEO-YAGEO-CC0603MRX6S5BB106_C3879288.html
footprint CAP-0603 (0603 (1608M) Capacitor)
pins: 1, 2

## CC0603MRX6S5BB226
designator C?  Capacitance: 22uF  (hidden comment: *)
Capacitor, Ceramic (MLCC), 22uF, ±20%, 6.3V, X6S, ±20%, SMD 0603; Manufacturer: YAGEO; Manufacturer Part Number: CC0603MRX6S5BB226; Package Size: 0603; JLCPCB Basic Part: No; JLCPCB Part Number: C723633; Supplier 1: LCSC; Category: Capacitors - MLCC; Supplier Part Number 1: C723633; Tolerance: ±20%; Voltage Rating: 6.3V; Temperature Coefficient: X6S; RoHS: Yes; ComponentLink1Description: Datasheet; ComponentLink1URL: https://wmsc.lcsc.com/wmsc/upload/file/pdf/v2/lcsc/2201242130_YAGEO-CC0603MRX6S5BB226_C723633.pdf; ComponentLink2Description: JLCPCB Part URL; ComponentLink2URL: https://jlcpcb.com/partdetail/C723633; ComponentLink3Description: LCSC Part URL; ComponentLink3URL: https://lcsc.com/product-detail/Multilayer-Ceramic-Capacitors-MLCC---SMD-SMT_YAGEO-YAGEO-CC0603MRX6S5BB226_C723633.html
footprint CAP-0603 (0603 (1608M) Capacitor)
pins: 1, 2

## CC0603MRX7R5BB475
designator C?  Capacitance: 4.7uF  (hidden comment: *)
Capacitor, Ceramic (MLCC), 4.7uF, ±20%, 6.3V, X7R, ±20%, SMD 0603; Manufacturer: YAGEO; Manufacturer Part Number: CC0603MRX7R5BB475; Package Size: 0603; JLCPCB Basic Part: No; JLCPCB Part Number: C1952593; Supplier 1: LCSC; Category: Capacitors - MLCC; Supplier Part Number 1: C1952593; Tolerance: ±20%; Voltage Rating: 6.3V; Temperature Coefficient: X7R; RoHS: Yes; ComponentLink1Description: Datasheet; ComponentLink1URL: https://wmsc.lcsc.com/wmsc/upload/file/pdf/v2/lcsc/2201291000_YAGEO-CC0603MRX7R5BB475_C1952593.pdf; ComponentLink2Description: JLCPCB Part URL; ComponentLink2URL: https://jlcpcb.com/partdetail/C1952593; ComponentLink3Description: LCSC Part URL; ComponentLink3URL: https://lcsc.com/product-detail/Multilayer-Ceramic-Capacitors-MLCC---SMD-SMT_YAGEO-YAGEO-CC0603MRX7R5BB475_C1952593.html
footprint CAP-0603 (0603 (1608M) Capacitor)
pins: 1, 2
